# Altium footprint library 3D_MIG_Controller.PCBLIB: 560 footprints (part 20 of 35)
Each footprint in its own frame and in the unit in brackets; x right, y up, seen from the top. Pads: shape width x height; smd on the part's side, far side on the other; paste and mask are expansions set on the pad; w line width, h text height; cw(c..) or ccw(c..) is an arc to the next point about the centre after c.
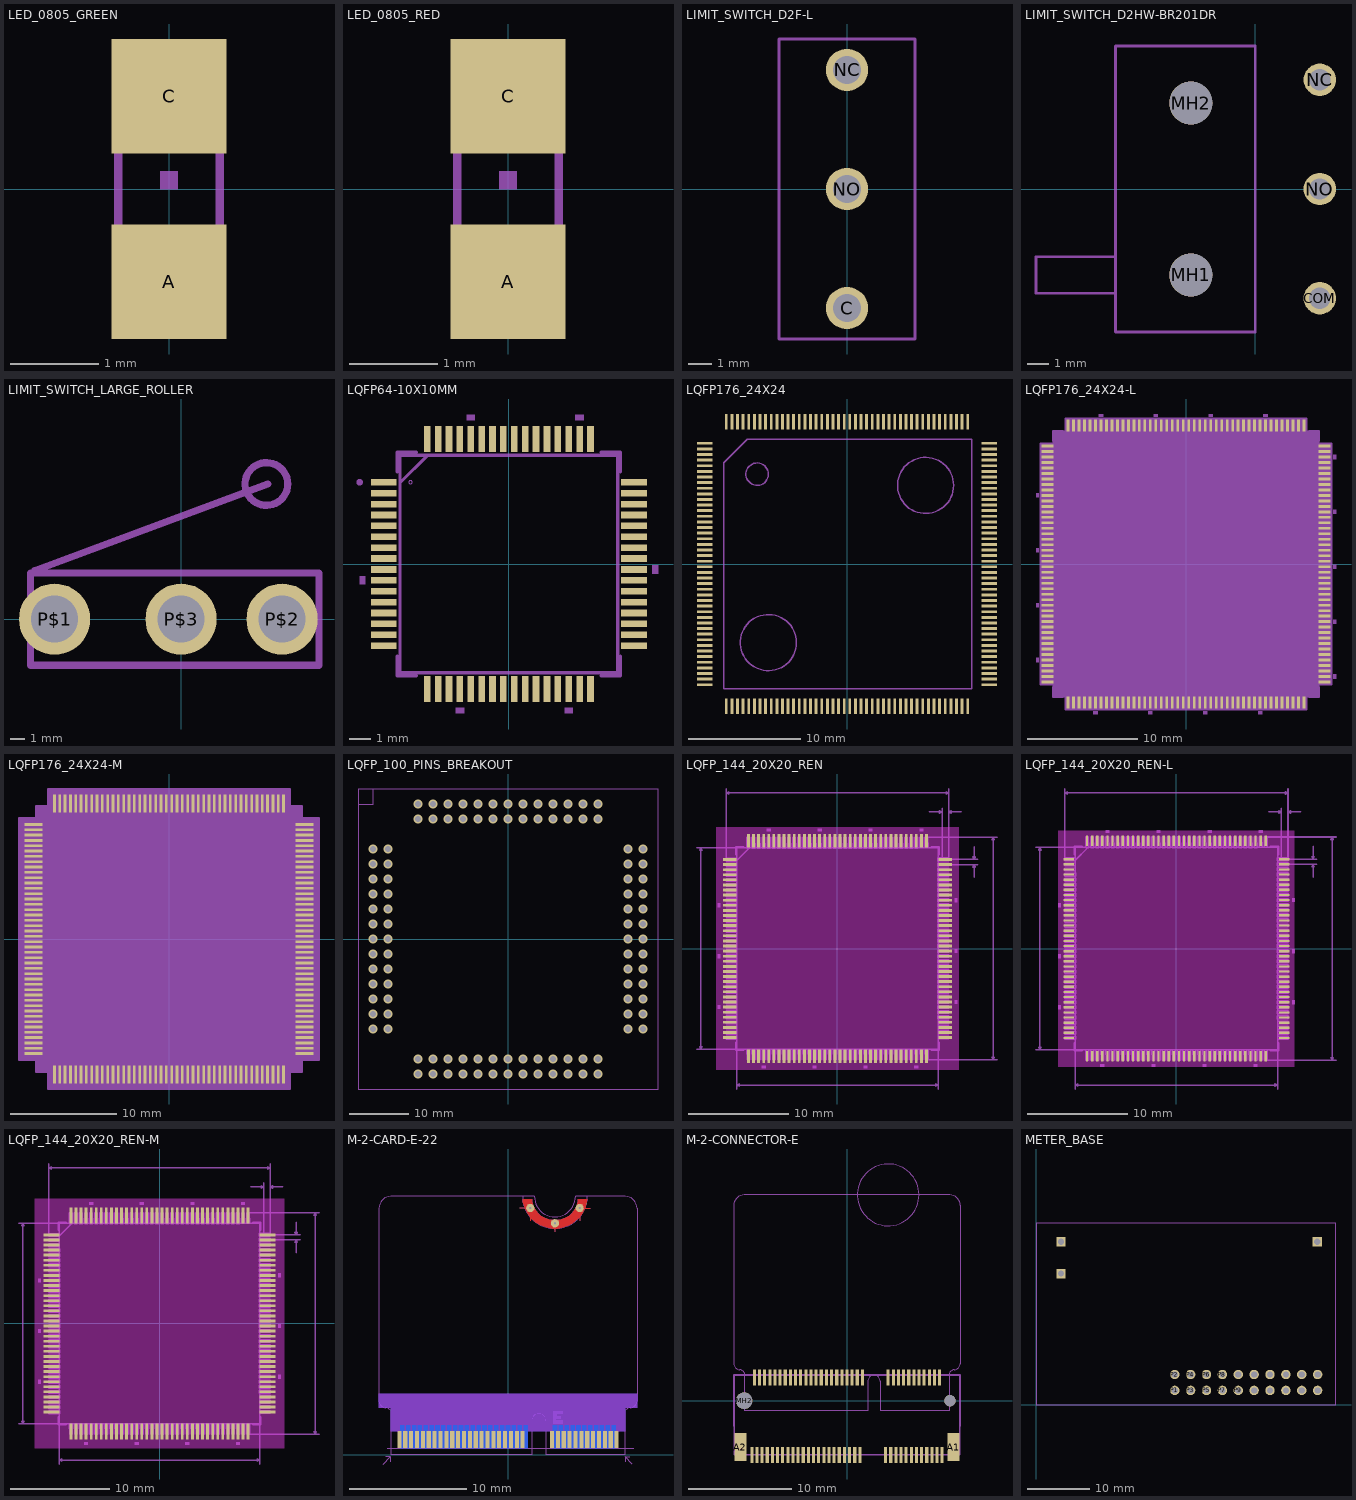
[diagram p19: the footprints below, top view; thin cyan lines are the x and y axes]

## LED_0805_GREEN [mil]
pads (2):
  rect 51.18x51.18 smd: A(0,-41.34) C(0,41.34)
tDocu:
  circle w4: c-17.72,33.46 r4.06
  region: 11.81,19.69 11.81,39.37 24.61,39.37 24.61,19.69
  region: -12.8,19.69 -12.8,29.53 -6.89,29.53 -6.89,19.69
  region: 6.89,19.69 6.89,29.53 12.8,29.53 12.8,19.69
  region: -7.87,19.69 -7.87,26.57 7.87,26.57 7.87,19.69
  region: 11.81,-39.37 11.81,-19.69 24.61,-19.69 24.61,-39.37
  region: -24.61,-39.37 -24.61,-19.69 -11.81,-19.69 -11.81,-39.37
  region: 6.89,-29.53 6.89,-19.69 12.8,-19.69 12.8,-29.53
  region: -12.8,-29.53 -12.8,-19.69 -6.89,-19.69 -6.89,-29.53
  region: -7.87,-26.57 -7.87,-19.69 7.87,-19.69 7.87,-26.57
  region: -23.62,19.69 -23.62,31.5 -11.81,31.5 -11.81,19.69
  region: -24.61,36.42 -24.61,39.37 -11.81,39.37 -11.81,36.42
  lines w4: -22.64,-19.69 -22.64,36.42 ; -13.78,-36.42 cw(c0,-38.55) 13.78,-36.42 ; -13.78,36.42 ccw(c0,38.55) 13.78,36.42 ; 22.64,-20.67 22.64,20.67
tPlace:
  region: -3.94,0 -3.94,7.87 3.94,7.87 3.94,0

## LED_0805_RED [mil]
pads (2):
  rect 51.18x51.18 smd: A(0,-41.34) C(0,41.34)
tDocu:
  circle w4: c-17.72,33.46 r4.06
  region: 11.81,19.69 11.81,39.37 24.61,39.37 24.61,19.69
  region: -12.8,19.69 -12.8,29.53 -6.89,29.53 -6.89,19.69
  region: 6.89,19.69 6.89,29.53 12.8,29.53 12.8,19.69
  region: -7.87,19.69 -7.87,26.57 7.87,26.57 7.87,19.69
  region: 11.81,-39.37 11.81,-19.69 24.61,-19.69 24.61,-39.37
  region: -24.61,-39.37 -24.61,-19.69 -11.81,-19.69 -11.81,-39.37
  region: 6.89,-29.53 6.89,-19.69 12.8,-19.69 12.8,-29.53
  region: -12.8,-29.53 -12.8,-19.69 -6.89,-19.69 -6.89,-29.53
  region: -7.87,-26.57 -7.87,-19.69 7.87,-19.69 7.87,-26.57
  region: -23.62,19.69 -23.62,31.5 -11.81,31.5 -11.81,19.69
  region: -24.61,36.42 -24.61,39.37 -11.81,39.37 -11.81,36.42
  lines w4: -22.64,-19.69 -22.64,36.42 ; -13.78,-36.42 cw(c0,-38.55) 13.78,-36.42 ; -13.78,36.42 ccw(c0,38.55) 13.78,36.42 ; 22.64,-20.67 22.64,20.67
tValues:
  text "RED" at 100,-50 h23.25
tPlace:
  region: -3.94,0 -3.94,7.87 3.94,7.87 3.94,0

## LIMIT_SWITCH_D2F-L [mil]
pads (3):
  round 70.86 hole 47.24: C(0,-200) NC(0,200) NO(0,0)
tPlace:
  lines w5: -114.17,-251.97 114.17,-251.97 114.17,251.97 -114.17,251.97 -114.17,-251.97

## LIMIT_SWITCH_D2HW-BR201DR [mm]
pads (5):
  round 1.508 hole 1: COM(3,-5.08) NC(3,5.08) NO(3,0)
  round 1.999 hole 1.999 unplated: MH1(-3,-4) MH2(-3,4)
tPlace:
  lines w0.127: -6.5,-4.85 -6.5,-3.15 ; -6.5,-4.85 -6.5,-6.65 0,-6.65 0,6.65 -6.5,6.65 -6.5,-3.15 ; -6.5,-4.85 -10.2,-4.85 -10.2,-3.15 -6.5,-3.15

## LIMIT_SWITCH_LARGE_ROLLER [mm]
pads (3):
  round 5 hole 3.3: P$1(-8.9,0) P$2(7.1,0) P$3(0,0)
tPlace:
  circle w0.508: c6,9.5 r1.5
  lines w0.508: -10.3,3.4 6.1,9.5 ; -10.6,-3.25 -10.6,3.25 9.7,3.25 9.7,-3.25 -10.6,-3.25
  text "C" at -9.7,-5.1 h1.57
  text "NC" at 6.4,-5.1 h1.57
  text "NO" at -1.2,-5.1 h1.57

## LQFP64-10X10MM [mil]
pads (64):
  rect 47x12 smd: 1(-226.38,147.64) 2(-226.38,127.95) 3(-226.38,108.27) 4(-226.38,88.58) 5(-226.38,68.9) 6(-226.38,49.21) 7(-226.38,29.53) 8(-226.38,9.84) 9(-226.38,-9.84) 10(-226.38,-29.53) 11(-226.38,-49.21) 12(-226.38,-68.9) 13(-226.38,-88.58) 14(-226.38,-108.27) 15(-226.38,-127.95) 16(-226.38,-147.64) 33(226.38,-147.64) 34(226.38,-127.95) 35(226.38,-108.27) 36(226.38,-88.58) 37(226.38,-68.9) 38(226.38,-49.21) 39(226.38,-29.53) 40(226.38,-9.84) 41(226.38,9.84) 42(226.38,29.53) 43(226.38,49.21) 44(226.38,68.9) 45(226.38,88.58) 46(226.38,108.27) 47(226.38,127.95) 48(226.38,147.64)
  rect 12x47 smd: 17(-147.64,-226.38) 18(-127.95,-226.38) 19(-108.27,-226.38) 20(-88.58,-226.38) 21(-68.9,-226.38) 22(-49.21,-226.38) 23(-29.53,-226.38) 24(-9.84,-226.38) 25(9.84,-226.38) 26(29.53,-226.38) 27(49.21,-226.38) 28(68.9,-226.38) 29(88.58,-226.38) 30(108.27,-226.38) 31(127.95,-226.38) 32(147.64,-226.38) 49(147.64,226.38) 50(127.95,226.38) 51(108.27,226.38) 52(88.58,226.38) 53(68.9,226.38) 54(49.21,226.38) 55(29.53,226.38) 56(9.84,226.38) 57(-9.84,226.38) 58(-29.53,226.38) 59(-49.21,226.38) 60(-68.9,226.38) 61(-88.58,226.38) 62(-108.27,226.38) 63(-127.95,226.38) 64(-147.64,226.38)
tDocu:
  lines w0: -181,148 ccw(c-178,148) -175,148 ccw(c-178,148) -181,148
  lines w6: -197,147 -147,197 ; -197,-197 197,-197 197,197 -197,197 -197,-197
tPlace:
  region: -269.88,-22.03 -269.88,-37.03 -259.88,-37.03 -259.88,-22.03
  region: -96.08,-259.88 -96.08,-269.88 -81.08,-269.88 -81.08,-259.88
  region: 100.77,-259.88 100.77,-269.88 115.77,-269.88 115.77,-259.88
  region: 269.88,-2.34 269.88,-17.34 259.88,-17.34 259.88,-2.34
  region: 120.45,259.88 120.45,269.88 135.45,269.88 135.45,259.88
  region: -76.4,259.88 -76.4,269.88 -61.4,269.88 -61.4,259.88
  lines w6: -202,-167 -202,-202 -167,-202 ; -202,167 -202,202 -167,202 ; 167,-202 202,-202 202,-167 ; 167,202 202,202 202,167 ; -273,148 ccw(c-270,148) -267,148 ccw(c-270,148) -273,148

## LQFP176_24X24 [mil]
pads (176):
  rect 54x10 smd: 1(-499,423.23) 2(-499,403.54) 3(-499,383.86) 4(-499,364.17) 5(-499,344.49) 6(-499,324.8) 7(-499,305.12) 8(-499,285.43) 9(-499,265.75) 10(-499,246.06) 11(-499,226.38) 12(-499,206.69) 13(-499,187.01) 14(-499,167.32) 15(-499,147.64) 16(-499,127.95) 17(-499,108.27) 18(-499,88.58) 19(-499,68.9) 20(-499,49.21) 21(-499,29.53) 22(-499,9.84) 23(-499,-9.84) 24(-499,-29.53) 25(-499,-49.21) 26(-499,-68.9) 27(-499,-88.58) 28(-499,-108.27) 29(-499,-127.95) 30(-499,-147.64) 31(-499,-167.32) 32(-499,-187.01) 33(-499,-206.69) 34(-499,-226.38) 35(-499,-246.06) 36(-499,-265.75) 37(-499,-285.43) 38(-499,-305.12) 39(-499,-324.8) 40(-499,-344.49) 41(-499,-364.17) 42(-499,-383.86) 43(-499,-403.54) 44(-499,-423.23) 89(499,-423.23) 90(499,-403.54) 91(499,-383.86) 92(499,-364.17) 93(499,-344.49) 94(499,-324.8) 95(499,-305.12) 96(499,-285.43) 97(499,-265.75) 98(499,-246.06) 99(499,-226.38) 100(499,-206.69) 101(499,-187.01) 102(499,-167.32) 103(499,-147.64) 104(499,-127.95) 105(499,-108.27) 106(499,-88.58) 107(499,-68.9) 108(499,-49.21) 109(499,-29.53) 110(499,-9.84) 111(499,9.84) 112(499,29.53) 113(499,49.21) 114(499,68.9) 115(499,88.58) 116(499,108.27) 117(499,127.95) 118(499,147.64) 119(499,167.32) 120(499,187.01) 121(499,206.69) 122(499,226.38) 123(499,246.06) 124(499,265.75) 125(499,285.43) 126(499,305.12) 127(499,324.8) 128(499,344.49) 129(499,364.17) 130(499,383.86) 131(499,403.54) 132(499,423.23)
  rect 10x54 smd: 45(-423.23,-499) 46(-403.54,-499) 47(-383.86,-499) 48(-364.17,-499) 49(-344.49,-499) 50(-324.8,-499) 51(-305.12,-499) 52(-285.43,-499) 53(-265.75,-499) 54(-246.06,-499) 55(-226.38,-499) 56(-206.69,-499) 57(-187.01,-499) 58(-167.32,-499) 59(-147.64,-499) 60(-127.95,-499) 61(-108.27,-499) 62(-88.58,-499) 63(-68.9,-499) 64(-49.21,-499) 65(-29.53,-499) 66(-9.84,-499) 67(9.84,-499) 68(29.53,-499) 69(49.21,-499) 70(68.9,-499) 71(88.58,-499) 72(108.27,-499) 73(127.95,-499) 74(147.64,-499) 75(167.32,-499) 76(187.01,-499) 77(206.69,-499) 78(226.38,-499) 79(246.06,-499) 80(265.75,-499) 81(285.43,-499) 82(305.12,-499) 83(324.8,-499) 84(344.49,-499) 85(364.17,-499) 86(383.86,-499) 87(403.54,-499) 88(423.23,-499) 133(423.23,499) 134(403.54,499) 135(383.86,499) 136(364.17,499) 137(344.49,499) 138(324.8,499) 139(305.12,499) 140(285.43,499) 141(265.75,499) 142(246.06,499) 143(226.38,499) 144(206.69,499) 145(187.01,499) 146(167.32,499) 147(147.64,499) 148(127.95,499) 149(108.27,499) 150(88.58,499) 151(68.9,499) 152(49.21,499) 153(29.53,499) 154(9.84,499) 155(-9.84,499) 156(-29.53,499) 157(-49.21,499) 158(-68.9,499) 159(-88.58,499) 160(-108.27,499) 161(-127.95,499) 162(-147.64,499) 163(-167.32,499) 164(-187.01,499) 165(-206.69,499) 166(-226.38,499) 167(-246.06,499) 168(-265.75,499) 169(-285.43,499) 170(-305.12,499) 171(-324.8,499) 172(-344.49,499) 173(-364.17,499) 174(-383.86,499) 175(-403.54,499) 176(-423.23,499)
tPlace:
  circle w5: c-314.96,314.96 r39.37
  circle w5: c-275.59,-275.59 r98.43
  circle w5: c275.59,275.59 r98.43
  lines w5: -433.07,-437.01 -433.07,354.33 -350.39,437.01 437.01,437.01 437.01,-437.01 -433.07,-437.01

## LQFP176_24X24-L [mil]
pads (176):
  rect 42x10 smd: 1(-497,423.23) 2(-497,403.54) 3(-497,383.86) 4(-497,364.17) 5(-497,344.49) 6(-497,324.8) 7(-497,305.12) 8(-497,285.43) 9(-497,265.75) 10(-497,246.06) 11(-497,226.38) 12(-497,206.69) 13(-497,187.01) 14(-497,167.32) 15(-497,147.64) 16(-497,127.95) 17(-497,108.27) 18(-497,88.58) 19(-497,68.9) 20(-497,49.21) 21(-497,29.53) 22(-497,9.84) 23(-497,-9.84) 24(-497,-29.53) 25(-497,-49.21) 26(-497,-68.9) 27(-497,-88.58) 28(-497,-108.27) 29(-497,-127.95) 30(-497,-147.64) 31(-497,-167.32) 32(-497,-187.01) 33(-497,-206.69) 34(-497,-226.38) 35(-497,-246.06) 36(-497,-265.75) 37(-497,-285.43) 38(-497,-305.12) 39(-497,-324.8) 40(-497,-344.49) 41(-497,-364.17) 42(-497,-383.86) 43(-497,-403.54) 44(-497,-423.23) 89(497,-423.23) 90(497,-403.54) 91(497,-383.86) 92(497,-364.17) 93(497,-344.49) 94(497,-324.8) 95(497,-305.12) 96(497,-285.43) 97(497,-265.75) 98(497,-246.06) 99(497,-226.38) 100(497,-206.69) 101(497,-187.01) 102(497,-167.32) 103(497,-147.64) 104(497,-127.95) 105(497,-108.27) 106(497,-88.58) 107(497,-68.9) 108(497,-49.21) 109(497,-29.53) 110(497,-9.84) 111(497,9.84) 112(497,29.53) 113(497,49.21) 114(497,68.9) 115(497,88.58) 116(497,108.27) 117(497,127.95) 118(497,147.64) 119(497,167.32) 120(497,187.01) 121(497,206.69) 122(497,226.38) 123(497,246.06) 124(497,265.75) 125(497,285.43) 126(497,305.12) 127(497,324.8) 128(497,344.49) 129(497,364.17) 130(497,383.86) 131(497,403.54) 132(497,423.23)
  rect 10x42 smd: 45(-423.23,-497) 46(-403.54,-497) 47(-383.86,-497) 48(-364.17,-497) 49(-344.49,-497) 50(-324.8,-497) 51(-305.12,-497) 52(-285.43,-497) 53(-265.75,-497) 54(-246.06,-497) 55(-226.38,-497) 56(-206.69,-497) 57(-187.01,-497) 58(-167.32,-497) 59(-147.64,-497) 60(-127.95,-497) 61(-108.27,-497) 62(-88.58,-497) 63(-68.9,-497) 64(-49.21,-497) 65(-29.53,-497) 66(-9.84,-497) 67(9.84,-497) 68(29.53,-497) 69(49.21,-497) 70(68.9,-497) 71(88.58,-497) 72(108.27,-497) 73(127.95,-497) 74(147.64,-497) 75(167.32,-497) 76(187.01,-497) 77(206.69,-497) 78(226.38,-497) 79(246.06,-497) 80(265.75,-497) 81(285.43,-497) 82(305.12,-497) 83(324.8,-497) 84(344.49,-497) 85(364.17,-497) 86(383.86,-497) 87(403.54,-497) 88(423.23,-497) 133(423.23,497) 134(403.54,497) 135(383.86,497) 136(364.17,497) 137(344.49,497) 138(324.8,497) 139(305.12,497) 140(285.43,497) 141(265.75,497) 142(246.06,497) 143(226.38,497) 144(206.69,497) 145(187.01,497) 146(167.32,497) 147(147.64,497) 148(127.95,497) 149(108.27,497) 150(88.58,497) 151(68.9,497) 152(49.21,497) 153(29.53,497) 154(9.84,497) 155(-9.84,497) 156(-29.53,497) 157(-49.21,497) 158(-68.9,497) 159(-88.58,497) 160(-108.27,497) 161(-127.95,497) 162(-147.64,497) 163(-167.32,497) 164(-187.01,497) 165(-206.69,497) 166(-226.38,497) 167(-246.06,497) 168(-265.75,497) 169(-285.43,497) 170(-305.12,497) 171(-324.8,497) 172(-344.49,497) 173(-364.17,497) 174(-383.86,497) 175(-403.54,497) 176(-423.23,497)
tDocu:
  drawing of 732 lines, arcs and shapes, not listed
  text "*" at -480,408 h62
tPlace:
  region: -538,253.56 -538,238.56 -528,238.56 -528,253.56
  region: -538,56.71 -538,41.71 -528,41.71 -528,56.71
  region: -538,-140.14 -538,-155.14 -528,-155.14 -528,-140.14
  region: -538,-336.99 -538,-351.99 -528,-351.99 -528,-336.99
  region: -332.3,-528 -332.3,-538 -317.3,-538 -317.3,-528
  region: -135.45,-528 -135.45,-538 -120.45,-538 -120.45,-528
  region: 61.4,-528 61.4,-538 76.4,-538 76.4,-528
  region: 258.25,-528 258.25,-538 273.25,-538 273.25,-528
  region: 538,-396.04 538,-411.04 528,-411.04 528,-396.04
  region: 538,-199.19 538,-214.19 528,-214.19 528,-199.19
  region: 538,-2.34 538,-17.34 528,-17.34 528,-2.34
  region: 538,194.51 538,179.51 528,179.51 528,194.51
  region: 538,391.36 538,376.36 528,376.36 528,391.36
  region: 277.93,528 277.93,538 292.93,538 292.93,528
  region: 81.08,528 81.08,538 96.08,538 96.08,528
  region: -115.77,528 -115.77,538 -100.77,538 -100.77,528
  region: -312.62,528 -312.62,538 -297.62,538 -297.62,528
  lines w6: -478,-441 -478,-478 -441,-478 ; -478,441 -478,478 -441,478 ; 441,-478 478,-478 478,-441 ; 441,478 478,478 478,441
tOrigins:
  lines w6: -10,0 10,0 ; 0,-10 0,10

## LQFP176_24X24-M [mil]
pads (176):
  rect 66x10 smd: 1(-501,423.23) 2(-501,403.54) 3(-501,383.86) 4(-501,364.17) 5(-501,344.49) 6(-501,324.8) 7(-501,305.12) 8(-501,285.43) 9(-501,265.75) 10(-501,246.06) 11(-501,226.38) 12(-501,206.69) 13(-501,187.01) 14(-501,167.32) 15(-501,147.64) 16(-501,127.95) 17(-501,108.27) 18(-501,88.58) 19(-501,68.9) 20(-501,49.21) 21(-501,29.53) 22(-501,9.84) 23(-501,-9.84) 24(-501,-29.53) 25(-501,-49.21) 26(-501,-68.9) 27(-501,-88.58) 28(-501,-108.27) 29(-501,-127.95) 30(-501,-147.64) 31(-501,-167.32) 32(-501,-187.01) 33(-501,-206.69) 34(-501,-226.38) 35(-501,-246.06) 36(-501,-265.75) 37(-501,-285.43) 38(-501,-305.12) 39(-501,-324.8) 40(-501,-344.49) 41(-501,-364.17) 42(-501,-383.86) 43(-501,-403.54) 44(-501,-423.23) 89(501,-423.23) 90(501,-403.54) 91(501,-383.86) 92(501,-364.17) 93(501,-344.49) 94(501,-324.8) 95(501,-305.12) 96(501,-285.43) 97(501,-265.75) 98(501,-246.06) 99(501,-226.38) 100(501,-206.69) 101(501,-187.01) 102(501,-167.32) 103(501,-147.64) 104(501,-127.95) 105(501,-108.27) 106(501,-88.58) 107(501,-68.9) 108(501,-49.21) 109(501,-29.53) 110(501,-9.84) 111(501,9.84) 112(501,29.53) 113(501,49.21) 114(501,68.9) 115(501,88.58) 116(501,108.27) 117(501,127.95) 118(501,147.64) 119(501,167.32) 120(501,187.01) 121(501,206.69) 122(501,226.38) 123(501,246.06) 124(501,265.75) 125(501,285.43) 126(501,305.12) 127(501,324.8) 128(501,344.49) 129(501,364.17) 130(501,383.86) 131(501,403.54) 132(501,423.23)
  rect 10x66 smd: 45(-423.23,-501) 46(-403.54,-501) 47(-383.86,-501) 48(-364.17,-501) 49(-344.49,-501) 50(-324.8,-501) 51(-305.12,-501) 52(-285.43,-501) 53(-265.75,-501) 54(-246.06,-501) 55(-226.38,-501) 56(-206.69,-501) 57(-187.01,-501) 58(-167.32,-501) 59(-147.64,-501) 60(-127.95,-501) 61(-108.27,-501) 62(-88.58,-501) 63(-68.9,-501) 64(-49.21,-501) 65(-29.53,-501) 66(-9.84,-501) 67(9.84,-501) 68(29.53,-501) 69(49.21,-501) 70(68.9,-501) 71(88.58,-501) 72(108.27,-501) 73(127.95,-501) 74(147.64,-501) 75(167.32,-501) 76(187.01,-501) 77(206.69,-501) 78(226.38,-501) 79(246.06,-501) 80(265.75,-501) 81(285.43,-501) 82(305.12,-501) 83(324.8,-501) 84(344.49,-501) 85(364.17,-501) 86(383.86,-501) 87(403.54,-501) 88(423.23,-501) 133(423.23,501) 134(403.54,501) 135(383.86,501) 136(364.17,501) 137(344.49,501) 138(324.8,501) 139(305.12,501) 140(285.43,501) 141(265.75,501) 142(246.06,501) 143(226.38,501) 144(206.69,501) 145(187.01,501) 146(167.32,501) 147(147.64,501) 148(127.95,501) 149(108.27,501) 150(88.58,501) 151(68.9,501) 152(49.21,501) 153(29.53,501) 154(9.84,501) 155(-9.84,501) 156(-29.53,501) 157(-49.21,501) 158(-68.9,501) 159(-88.58,501) 160(-108.27,501) 161(-127.95,501) 162(-147.64,501) 163(-167.32,501) 164(-187.01,501) 165(-206.69,501) 166(-226.38,501) 167(-246.06,501) 168(-265.75,501) 169(-285.43,501) 170(-305.12,501) 171(-324.8,501) 172(-344.49,501) 173(-364.17,501) 174(-383.86,501) 175(-403.54,501) 176(-423.23,501)
tDocu:
  drawing of 732 lines, arcs and shapes, not listed
  text "*" at -480,408 h62
tPlace:
  region: -554,253.56 -554,238.56 -544,238.56 -544,253.56
  region: -554,56.71 -554,41.71 -544,41.71 -544,56.71
  region: -554,-140.14 -554,-155.14 -544,-155.14 -544,-140.14
  region: -554,-336.99 -554,-351.99 -544,-351.99 -544,-336.99
  region: -332.3,-544 -332.3,-554 -317.3,-554 -317.3,-544
  region: -135.45,-544 -135.45,-554 -120.45,-554 -120.45,-544
  region: 61.4,-544 61.4,-554 76.4,-554 76.4,-544
  region: 258.25,-544 258.25,-554 273.25,-554 273.25,-544
  region: 554,-396.04 554,-411.04 544,-411.04 544,-396.04
  region: 554,-199.19 554,-214.19 544,-214.19 544,-199.19
  region: 554,-2.34 554,-17.34 544,-17.34 544,-2.34
  region: 554,194.51 554,179.51 544,179.51 544,194.51
  region: 554,391.36 554,376.36 544,376.36 544,391.36
  region: 277.93,544 277.93,554 292.93,554 292.93,544
  region: 81.08,544 81.08,554 96.08,554 96.08,544
  region: -115.77,544 -115.77,554 -100.77,554 -100.77,544
  region: -312.62,544 -312.62,554 -297.62,554 -297.62,544
  lines w6: -478,-441 -478,-478 -441,-478 ; -478,441 -478,478 -441,478 ; 441,-478 478,-478 478,-441 ; 441,478 478,478 478,441
tOrigins:
  lines w6: -10,0 10,0 ; 0,-10 0,10

## LQFP_100_PINS_BREAKOUT [mm]
pads (104):
  round 1.508 hole 1: P$000(-20.32,15.24) P$1(-22.86,15.24) P$2(-22.86,12.7) P$3(-20.32,12.7) P$4(-22.86,10.16) P$5(-20.32,10.16) P$6(-22.86,7.62) P$7(-20.32,7.62) P$8(-22.86,5.08) P$9(-20.32,5.08) P$10(-22.86,2.54) P$11(-20.32,2.54) P$12(-22.86,0) P$13(-20.32,0) P$14(-22.86,-2.54) P$15(-20.32,-2.54) P$16(-22.86,-5.08) P$17(-20.32,-5.08) P$18(-22.86,-7.62) P$19(-20.32,-7.62) P$20(-22.86,-10.16) P$21(-20.32,-10.16) P$22(-22.86,-12.7) P$23(-20.32,-12.7) P$24(-22.86,-15.24) P$25(-20.32,-15.24) P$26(-15.24,-22.86) P$27(-12.7,-22.86) P$28(-12.7,-20.32) P$29(-10.16,-22.86) P$30(-10.16,-20.32) P$31(-7.62,-22.86) P$32(-7.62,-20.32) P$33(-5.08,-22.86) P$34(-5.08,-20.32) P$35(-2.54,-22.86) P$36(-2.54,-20.32) P$37(0,-22.86) P$38(0,-20.32) P$39(2.54,-22.86) P$40(2.54,-20.32) P$41(5.08,-22.86) P$42(5.08,-20.32) P$43(7.62,-22.86) P$44(7.62,-20.32) P$45(10.16,-22.86) P$46(10.16,-20.32) P$47(12.7,-22.86) P$48(12.7,-20.32) P$49(15.24,-22.86) P$50(15.24,-20.32) P$51(22.86,-15.24) P$52(22.86,-12.7) P$53(20.32,-12.7) P$54(22.86,-10.16) P$55(20.32,-10.16) P$56(22.86,-7.62) P$57(20.32,-7.62) P$58(22.86,-5.08) P$59(20.32,-5.08) P$60(22.86,-2.54) P$61(20.32,-2.54) P$62(22.86,0) P$63(20.32,0) P$64(22.86,2.54) P$65(20.32,2.54) P$66(22.86,5.08) P$67(20.32,5.08) P$68(22.86,7.62) P$69(20.32,7.62) P$70(22.86,10.16) P$71(20.32,10.16) P$72(22.86,12.7) P$73(20.32,12.7) P$74(22.86,15.24) P$75(20.32,15.24) P$76(15.24,22.86) P$77(12.7,22.86) P$78(12.7,20.32) P$79(10.16,22.86) P$80(10.16,20.32) P$81(7.62,22.86) P$82(7.62,20.32) P$83(5.08,22.86) P$84(5.08,20.32) P$85(2.54,22.86) P$86(2.54,20.32) P$87(0,22.86) P$88(0,20.32) P$89(-2.54,22.86) P$90(-2.54,20.32) P$91(-5.08,22.86) P$92(-5.08,20.32) P$93(-7.62,22.86) P$94(-7.62,20.32) P$95(-10.16,22.86) P$96(-10.16,20.32) P$97(-12.7,22.86) P$98(-12.7,20.32) P$99(-15.24,22.86) P$100(-15.24,20.32) P$261(-15.24,-20.32) P$510(20.32,-15.24) P$760(15.24,20.32)
tPlace:
  lines w0.127: -25.4,22.86 -25.4,25.4 -22.86,25.4 ; -25.4,22.86 -25.4,-25.4 25.4,-25.4 25.4,25.4 -22.86,25.4 ; -25.4,22.86 -22.86,22.86 -22.86,25.4

## LQFP_144_20X20_REN [mil]
pads (144):
  rect 53.56x11 smd: 1(-424,350) 2(-424,330) 3(-424,310) 4(-424,290) 5(-424,270) 6(-424,250) 7(-424,230) 8(-424,210) 9(-424,190) 10(-424,170) 11(-424,150) 12(-424,130) 13(-424,110) 14(-424,90) 15(-424,70) 16(-424,50) 17(-424,30) 18(-424,10) 19(-424,-10) 20(-424,-30) 21(-424,-50) 22(-424,-70) 23(-424,-90) 24(-424,-110) 25(-424,-130) 26(-424,-150) 27(-424,-170) 28(-424,-190) 29(-424,-210) 30(-424,-230) 31(-424,-250) 32(-424,-270) 33(-424,-290) 34(-424,-310) 35(-424,-330) 36(-424,-350) 73(424,-350) 74(424,-330) 75(424,-310) 76(424,-290) 77(424,-270) 78(424,-250) 79(424,-230) 80(424,-210) 81(424,-190) 82(424,-170) 83(424,-150) 84(424,-130) 85(424,-110) 86(424,-90) 87(424,-70) 88(424,-50) 89(424,-30) 90(424,-10) 91(424,10) 92(424,30) 93(424,50) 94(424,70) 95(424,90) 96(424,110) 97(424,130) 98(424,150) 99(424,170) 100(424,190) 101(424,210) 102(424,230) 103(424,250) 104(424,270) 105(424,290) 106(424,310) 107(424,330) 108(424,350)
  rect 11x53.56 smd: 37(-350,-424) 38(-330,-424) 39(-310,-424) 40(-290,-424) 41(-270,-424) 42(-250,-424) 43(-230,-424) 44(-210,-424) 45(-190,-424) 46(-170,-424) 47(-150,-424) 48(-130,-424) 49(-110,-424) 50(-90,-424) 51(-70,-424) 52(-50,-424) 53(-30,-424) 54(-10,-424) 55(10,-424) 56(30,-424) 57(50,-424) 58(70,-424) 59(90,-424) 60(110,-424) 61(130,-424) 62(150,-424) 63(170,-424) 64(190,-424) 65(210,-424) 66(230,-424) 67(250,-424) 68(270,-424) 69(290,-424) 70(310,-424) 71(330,-424) 72(350,-424) 109(350,424) 110(330,424) 111(310,424) 112(290,424) 113(270,424) 114(250,424) 115(230,424) 116(210,424) 117(190,424) 118(170,424) 119(150,424) 120(130,424) 121(110,424) 122(90,424) 123(70,424) 124(50,424) 125(30,424) 126(10,424) 127(-10,424) 128(-30,424) 129(-50,424) 130(-70,424) 131(-90,424) 132(-110,424) 133(-130,424) 134(-150,424) 135(-170,424) 136(-190,424) 137(-210,424) 138(-230,424) 139(-250,424) 140(-270,424) 141(-290,424) 142(-310,424) 143(-330,424) 144(-350,424)
Top keep-out:
  region: -475.78,-475.78 -475.78,475.78 475.78,475.78 475.78,-475.78
tDocu:
  drawing of 582 lines, arcs and shapes, not listed
  text "*" at -403,335 h77.5
tPlace:
  region: -470.78,177.5 -470.78,162.5 -460.78,162.5 -460.78,177.5
  region: -470.78,-22.5 -470.78,-37.5 -460.78,-37.5 -460.78,-22.5
  region: -470.78,-222.5 -470.78,-237.5 -460.78,-237.5 -460.78,-222.5
  region: -297.5,-460.78 -297.5,-470.78 -282.5,-470.78 -282.5,-460.78
  region: -97.5,-460.78 -97.5,-470.78 -82.5,-470.78 -82.5,-460.78
  region: 102.5,-460.78 102.5,-470.78 117.5,-470.78 117.5,-460.78
  region: 302.5,-460.78 302.5,-470.78 317.5,-470.78 317.5,-460.78
  region: 470.78,-202.5 470.78,-217.5 460.78,-217.5 460.78,-202.5
  region: 470.78,-2.5 470.78,-17.5 460.78,-17.5 460.78,-2.5
  region: 470.78,197.5 470.78,182.5 460.78,182.5 460.78,197.5
  region: 322.5,460.78 322.5,470.78 337.5,470.78 337.5,460.78
  region: 122.5,460.78 122.5,470.78 137.5,470.78 137.5,460.78
  region: -77.5,460.78 -77.5,470.78 -62.5,470.78 -62.5,460.78
  region: -277.5,460.78 -277.5,470.78 -262.5,470.78 -262.5,460.78
  lines w6: -400,-369 -400,-400 -369,-400 ; -400,369 -400,400 -369,400 ; 369,-400 400,-400 400,-369 ; 369,400 400,400 400,369
  text "*" at -498,350 h77.5
Measures:
  lines w6: -552,-396 -537,-396 ; -552,396 -537,396 ; -437,350 -437,612 ; -437,627 -437,612 ; -396,-552 -396,-537 ; -396,-350 -396,-537 ; -350,-396 -537,-396 ; -350,396 -537,396 ; 350,-437 612,-437 ; 350,437 612,437 ; 361,537 411,537 ; 396,-552 396,-537 ; 396,-350 396,-537 ; 411,350 411,537 ; 411,552 411,537 ; 424,330 537,330 ; 424,350 437,350 ; 437,627 437,612 ; 487,537 437,537 ; 537,280 537,330 ; 537,400 537,350 ; 552,330 537,330 ; 552,350 537,350 ; 627,-437 612,-437 ; 627,437 612,437 ; -537,-396 -537,396 ; -537,-396 -542,-386 -532,-386 -537,-396 ; -537,396 -542,386 -532,386 -537,396 ; -437,612 437,612 ; -437,612 -427,617 -427,607 -437,612 ; -396,-537 396,-537 ; -396,-537 -386,-532 -386,-542 -396,-537 ; 396,-537 386,-532 386,-542 396,-537 ; 411,537 401,542 401,532 411,537 ; 437,350 537,350 ; 437,350 437,537 ; 437,537 447,542 447,532 437,537 ; 437,537 437,612 ; 437,612 427,617 427,607 437,612 ; 537,330 532,320 542,320 537,330 ; 537,350 532,360 542,360 537,350 ; 612,-437 612,437 ; 612,-437 607,-427 617,-427 612,-437 ; 612,437 607,427 617,427 612,437
  text "Default Horiz Padstyle: r28_136" at -659,-687 h77.5
  text "Default Vert Padstyle: r28_136" at -637,-747 h77.5
  text "Alt 1 Padstyle: b152_229h76" at -583,-927 h77.5
  text "Alt 2 Padstyle: b229_152h76" at -583,-987 h77.5
  text "0.02in/0.508mm" at 557,328 h38.75
  text "0.026in/0.66mm" at 276,557 h38.75
  text "0.874in/22.2mm" at -148,632 h38.75
  text "0.791in/20.091mm" at -170,-582 h38.75
  text "0.791in/20.091mm" at -898,-12 h38.75
  text "0.874in/22.2mm" at 632,-12 h38.75

## LQFP_144_20X20_REN-L [mil]
pads (144):
  rect 41.75x9.03 smd: 1(-422.03,350) 2(-422.03,330) 3(-422.03,310) 4(-422.03,290) 5(-422.03,270) 6(-422.03,250) 7(-422.03,230) 8(-422.03,210) 9(-422.03,190) 10(-422.03,170) 11(-422.03,150) 12(-422.03,130) 13(-422.03,110) 14(-422.03,90) 15(-422.03,70) 16(-422.03,50) 17(-422.03,30) 18(-422.03,10) 19(-422.03,-10) 20(-422.03,-30) 21(-422.03,-50) 22(-422.03,-70) 23(-422.03,-90) 24(-422.03,-110) 25(-422.03,-130) 26(-422.03,-150) 27(-422.03,-170) 28(-422.03,-190) 29(-422.03,-210) 30(-422.03,-230) 31(-422.03,-250) 32(-422.03,-270) 33(-422.03,-290) 34(-422.03,-310) 35(-422.03,-330) 36(-422.03,-350) 73(422.03,-350) 74(422.03,-330) 75(422.03,-310) 76(422.03,-290) 77(422.03,-270) 78(422.03,-250) 79(422.03,-230) 80(422.03,-210) 81(422.03,-190) 82(422.03,-170) 83(422.03,-150) 84(422.03,-130) 85(422.03,-110) 86(422.03,-90) 87(422.03,-70) 88(422.03,-50) 89(422.03,-30) 90(422.03,-10) 91(422.03,10) 92(422.03,30) 93(422.03,50) 94(422.03,70) 95(422.03,90) 96(422.03,110) 97(422.03,130) 98(422.03,150) 99(422.03,170) 100(422.03,190) 101(422.03,210) 102(422.03,230) 103(422.03,250) 104(422.03,270) 105(422.03,290) 106(422.03,310) 107(422.03,330) 108(422.03,350)
  rect 9.03x41.75 smd: 37(-350,-422.03) 38(-330,-422.03) 39(-310,-422.03) 40(-290,-422.03) 41(-270,-422.03) 42(-250,-422.03) 43(-230,-422.03) 44(-210,-422.03) 45(-190,-422.03) 46(-170,-422.03) 47(-150,-422.03) 48(-130,-422.03) 49(-110,-422.03) 50(-90,-422.03) 51(-70,-422.03) 52(-50,-422.03) 53(-30,-422.03) 54(-10,-422.03) 55(10,-422.03) 56(30,-422.03) 57(50,-422.03) 58(70,-422.03) 59(90,-422.03) 60(110,-422.03) 61(130,-422.03) 62(150,-422.03) 63(170,-422.03) 64(190,-422.03) 65(210,-422.03) 66(230,-422.03) 67(250,-422.03) 68(270,-422.03) 69(290,-422.03) 70(310,-422.03) 71(330,-422.03) 72(350,-422.03) 109(350,422.03) 110(330,422.03) 111(310,422.03) 112(290,422.03) 113(270,422.03) 114(250,422.03) 115(230,422.03) 116(210,422.03) 117(190,422.03) 118(170,422.03) 119(150,422.03) 120(130,422.03) 121(110,422.03) 122(90,422.03) 123(70,422.03) 124(50,422.03) 125(30,422.03) 126(10,422.03) 127(-10,422.03) 128(-30,422.03) 129(-50,422.03) 130(-70,422.03) 131(-90,422.03) 132(-110,422.03) 133(-130,422.03) 134(-150,422.03) 135(-170,422.03) 136(-190,422.03) 137(-210,422.03) 138(-230,422.03) 139(-250,422.03) 140(-270,422.03) 141(-290,422.03) 142(-310,422.03) 143(-330,422.03) 144(-350,422.03)
Top keep-out:
  region: -461.91,-461.91 -461.91,461.91 461.91,461.91 461.91,-461.91
tDocu:
  drawing of 582 lines, arcs and shapes, not listed
  text "*" at -403,335 h77.5
tPlace:
  region: -462.91,177.5 -462.91,162.5 -452.91,162.5 -452.91,177.5
  region: -462.91,-22.5 -462.91,-37.5 -452.91,-37.5 -452.91,-22.5
  region: -462.91,-222.5 -462.91,-237.5 -452.91,-237.5 -452.91,-222.5
  region: -297.5,-452.91 -297.5,-462.91 -282.5,-462.91 -282.5,-452.91
  region: -97.5,-452.91 -97.5,-462.91 -82.5,-462.91 -82.5,-452.91
  region: 102.5,-452.91 102.5,-462.91 117.5,-462.91 117.5,-452.91
  region: 302.5,-452.91 302.5,-462.91 317.5,-462.91 317.5,-452.91
  region: 462.91,-202.5 462.91,-217.5 452.91,-217.5 452.91,-202.5
  region: 462.91,-2.5 462.91,-17.5 452.91,-17.5 452.91,-2.5
  region: 462.91,197.5 462.91,182.5 452.91,182.5 452.91,197.5
  region: 322.5,452.91 322.5,462.91 337.5,462.91 337.5,452.91
  region: 122.5,452.91 122.5,462.91 137.5,462.91 137.5,452.91
  region: -77.5,452.91 -77.5,462.91 -62.5,462.91 -62.5,452.91
  region: -277.5,452.91 -277.5,462.91 -262.5,462.91 -262.5,452.91
  lines w6: -400,-368 -400,-400 -368,-400 ; -400,368 -400,400 -368,400 ; 368,-400 400,-400 400,-368 ; 368,400 400,400 400,368
  text "*" at -491,350 h77.5
Measures:
  lines w6: -550,-396 -535,-396 ; -550,396 -535,396 ; -437,350 -437,610 ; -437,625 -437,610 ; -396,-550 -396,-535 ; -396,-350 -396,-535 ; -350,-396 -535,-396 ; -350,396 -535,396 ; 350,-437 610,-437 ; 350,437 610,437 ; 361,535 411,535 ; 396,-550 396,-535 ; 396,-350 396,-535 ; 411,350 411,535 ; 411,550 411,535 ; 422,330 535,330 ; 422,350 437,350 ; 437,625 437,610 ; 487,535 437,535 ; 535,280 535,330 ; 535,400 535,350 ; 550,330 535,330 ; 550,350 535,350 ; 625,-437 610,-437 ; 625,437 610,437 ; -535,-396 -535,396 ; -535,-396 -540,-386 -530,-386 -535,-396 ; -535,396 -540,386 -530,386 -535,396 ; -437,610 437,610 ; -437,610 -427,615 -427,605 -437,610 ; -396,-535 396,-535 ; -396,-535 -386,-530 -386,-540 -396,-535 ; 396,-535 386,-530 386,-540 396,-535 ; 411,535 401,540 401,530 411,535 ; 437,350 535,350 ; 437,350 437,535 ; 437,535 447,540 447,530 437,535 ; 437,535 437,610 ; 437,610 427,615 427,605 437,610 ; 535,330 530,320 540,320 535,330 ; 535,350 530,360 540,360 535,350 ; 610,-437 610,437 ; 610,-437 605,-427 615,-427 610,-437 ; 610,437 605,427 615,427 610,437
  text "Default Horiz Padstyle: r23_106" at -659,-685 h77.5
  text "Default Vert Padstyle: r23_106" at -637,-745 h77.5
  text "Alt 1 Padstyle: b152_229h76" at -583,-925 h77.5
  text "Alt 2 Padstyle: b229_152h76" at -583,-985 h77.5
  text "0.02in/0.508mm" at 555,328 h38.75
  text "0.026in/0.66mm" at 276,555 h38.75
  text "0.874in/22.2mm" at -148,630 h38.75
  text "0.791in/20.091mm" at -170,-580 h38.75
  text "0.791in/20.091mm" at -896,-12 h38.75
  text "0.874in/22.2mm" at 630,-12 h38.75

## LQFP_144_20X20_REN-M [mil]
pads (144):
  rect 63.15x11 smd: 1(-427.08,350) 2(-427.08,330) 3(-427.08,310) 4(-427.08,290) 5(-427.08,270) 6(-427.08,250) 7(-427.08,230) 8(-427.08,210) 9(-427.08,190) 10(-427.08,170) 11(-427.08,150) 12(-427.08,130) 13(-427.08,110) 14(-427.08,90) 15(-427.08,70) 16(-427.08,50) 17(-427.08,30) 18(-427.08,10) 19(-427.08,-10) 20(-427.08,-30) 21(-427.08,-50) 22(-427.08,-70) 23(-427.08,-90) 24(-427.08,-110) 25(-427.08,-130) 26(-427.08,-150) 27(-427.08,-170) 28(-427.08,-190) 29(-427.08,-210) 30(-427.08,-230) 31(-427.08,-250) 32(-427.08,-270) 33(-427.08,-290) 34(-427.08,-310) 35(-427.08,-330) 36(-427.08,-350) 73(427.08,-350) 74(427.08,-330) 75(427.08,-310) 76(427.08,-290) 77(427.08,-270) 78(427.08,-250) 79(427.08,-230) 80(427.08,-210) 81(427.08,-190) 82(427.08,-170) 83(427.08,-150) 84(427.08,-130) 85(427.08,-110) 86(427.08,-90) 87(427.08,-70) 88(427.08,-50) 89(427.08,-30) 90(427.08,-10) 91(427.08,10) 92(427.08,30) 93(427.08,50) 94(427.08,70) 95(427.08,90) 96(427.08,110) 97(427.08,130) 98(427.08,150) 99(427.08,170) 100(427.08,190) 101(427.08,210) 102(427.08,230) 103(427.08,250) 104(427.08,270) 105(427.08,290) 106(427.08,310) 107(427.08,330) 108(427.08,350)
  rect 11x63.15 smd: 37(-350,-427.08) 38(-330,-427.08) 39(-310,-427.08) 40(-290,-427.08) 41(-270,-427.08) 42(-250,-427.08) 43(-230,-427.08) 44(-210,-427.08) 45(-190,-427.08) 46(-170,-427.08) 47(-150,-427.08) 48(-130,-427.08) 49(-110,-427.08) 50(-90,-427.08) 51(-70,-427.08) 52(-50,-427.08) 53(-30,-427.08) 54(-10,-427.08) 55(10,-427.08) 56(30,-427.08) 57(50,-427.08) 58(70,-427.08) 59(90,-427.08) 60(110,-427.08) 61(130,-427.08) 62(150,-427.08) 63(170,-427.08) 64(190,-427.08) 65(210,-427.08) 66(230,-427.08) 67(250,-427.08) 68(270,-427.08) 69(290,-427.08) 70(310,-427.08) 71(330,-427.08) 72(350,-427.08) 109(350,427.08) 110(330,427.08) 111(310,427.08) 112(290,427.08) 113(270,427.08) 114(250,427.08) 115(230,427.08) 116(210,427.08) 117(190,427.08) 118(170,427.08) 119(150,427.08) 120(130,427.08) 121(110,427.08) 122(90,427.08) 123(70,427.08) 124(50,427.08) 125(30,427.08) 126(10,427.08) 127(-10,427.08) 128(-30,427.08) 129(-50,427.08) 130(-70,427.08) 131(-90,427.08) 132(-110,427.08) 133(-130,427.08) 134(-150,427.08) 135(-170,427.08) 136(-190,427.08) 137(-210,427.08) 138(-230,427.08) 139(-250,427.08) 140(-270,427.08) 141(-290,427.08) 142(-310,427.08) 143(-330,427.08) 144(-350,427.08)
Top keep-out:
  region: -493.65,-493.65 -493.65,493.65 493.65,493.65 493.65,-493.65
tDocu:
  drawing of 582 lines, arcs and shapes, not listed
  text "*" at -403,335 h77.5
tPlace:
  region: -478.65,177.5 -478.65,162.5 -468.65,162.5 -468.65,177.5
  region: -478.65,-22.5 -478.65,-37.5 -468.65,-37.5 -468.65,-22.5
  region: -478.65,-222.5 -478.65,-237.5 -468.65,-237.5 -468.65,-222.5
  region: -297.5,-468.65 -297.5,-478.65 -282.5,-478.65 -282.5,-468.65
  region: -97.5,-468.65 -97.5,-478.65 -82.5,-478.65 -82.5,-468.65
  region: 102.5,-468.65 102.5,-478.65 117.5,-478.65 117.5,-468.65
  region: 302.5,-468.65 302.5,-478.65 317.5,-478.65 317.5,-468.65
  region: 478.65,-202.5 478.65,-217.5 468.65,-217.5 468.65,-202.5
  region: 478.65,-2.5 478.65,-17.5 468.65,-17.5 468.65,-2.5
  region: 478.65,197.5 478.65,182.5 468.65,182.5 468.65,197.5
  region: 322.5,468.65 322.5,478.65 337.5,478.65 337.5,468.65
  region: 122.5,468.65 122.5,478.65 137.5,478.65 137.5,468.65
  region: -77.5,468.65 -77.5,478.65 -62.5,478.65 -62.5,468.65
  region: -277.5,468.65 -277.5,478.65 -262.5,478.65 -262.5,468.65
  lines w6: -400,-369 -400,-400 -369,-400 ; -400,369 -400,400 -369,400 ; 369,-400 400,-400 400,-369 ; 369,400 400,400 400,369
  text "*" at -506,350 h77.5
Measures:
  lines w6: -555,-396 -540,-396 ; -555,396 -540,396 ; -437,350 -437,615 ; -437,630 -437,615 ; -396,-555 -396,-540 ; -396,-350 -396,-540 ; -350,-396 -540,-396 ; -350,396 -540,396 ; 350,-437 615,-437 ; 350,437 615,437 ; 361,540 411,540 ; 396,-555 396,-540 ; 396,-350 396,-540 ; 411,350 411,540 ; 411,555 411,540 ; 427,330 540,330 ; 427,350 437,350 ; 437,630 437,615 ; 487,540 437,540 ; 540,280 540,330 ; 540,400 540,350 ; 555,330 540,330 ; 555,350 540,350 ; 630,-437 615,-437 ; 630,437 615,437 ; -540,-396 -540,396 ; -540,-396 -545,-386 -535,-386 -540,-396 ; -540,396 -545,386 -535,386 -540,396 ; -437,615 437,615 ; -437,615 -427,620 -427,610 -437,615 ; -396,-540 396,-540 ; -396,-540 -386,-535 -386,-545 -396,-540 ; 396,-540 386,-535 386,-545 396,-540 ; 411,540 401,545 401,535 411,540 ; 437,350 540,350 ; 437,350 437,540 ; 437,540 447,545 447,535 437,540 ; 437,540 437,615 ; 437,615 427,620 427,610 437,615 ; 540,330 535,320 545,320 540,330 ; 540,350 535,360 545,360 540,350 ; 615,-437 615,437 ; 615,-437 610,-427 620,-427 615,-437 ; 615,437 610,427 620,427 615,437
  text "Default Horiz Padstyle: r28_160" at -659,-690 h77.5
  text "Default Vert Padstyle: r28_160" at -637,-750 h77.5
  text "Alt 1 Padstyle: b152_229h76" at -583,-930 h77.5
  text "Alt 2 Padstyle: b229_152h76" at -583,-990 h77.5
  text "0.02in/0.508mm" at 560,328 h38.75
  text "0.026in/0.66mm" at 276,560 h38.75
  text "0.874in/22.2mm" at -148,635 h38.75
  text "0.791in/20.091mm" at -170,-585 h38.75
  text "0.791in/20.091mm" at -901,-12 h38.75
  text "0.874in/22.2mm" at 635,-12 h38.75

## M-2-CARD-E-22 [mm]
pads (70):
  rect 0.35x1.45 smd paste+0: 1(9.25,1.275) 3(8.75,1.275) 5(8.25,1.275) 7(7.75,1.275) 9(7.25,1.275) 11(6.75,1.275) 13(6.25,1.275) 15(5.75,1.275) 17(5.25,1.275) 19(4.75,1.275) 21(4.25,1.275) 23(3.75,1.275) 33(1.25,1.275) 35(0.75,1.275) 37(0.25,1.275) 39(-0.25,1.275) 41(-0.75,1.275) 43(-1.25,1.275) 45(-1.75,1.275) 47(-2.25,1.275) 49(-2.75,1.275) 51(-3.25,1.275) 53(-3.75,1.275) 55(-4.25,1.275) 57(-4.75,1.275) 59(-5.25,1.275) 61(-5.75,1.275) 63(-6.25,1.275) 65(-6.75,1.275) 67(-7.25,1.275) 69(-7.75,1.275) 71(-8.25,1.275) 73(-8.75,1.275) 75(-9.25,1.275)
  rect 0.35x1.95 smd far side paste+0: 2(9,1.525) 4(8.5,1.525) 6(8,1.525) 8(7.5,1.525) 10(7,1.525) 12(6.5,1.525) 14(6,1.525) 16(5.5,1.525) 18(5,1.525) 20(4.5,1.525) 22(4,1.525) 32(1.5,1.525) 34(1,1.525) 36(0.5,1.525) 38(0,1.525) 40(-0.5,1.525) 42(-1,1.525) 44(-1.5,1.525) 46(-2,1.525) 48(-2.5,1.525) 50(-3,1.525) 52(-3.5,1.525) 54(-4,1.525) 56(-4.5,1.525) 58(-5,1.525) 60(-5.5,1.525) 62(-6,1.525) 64(-6.5,1.525) 66(-7,1.525) 68(-7.5,1.525) 70(-8,1.525) 72(-8.5,1.525) 74(-9,1.525)
  round 0.708 hole 0.2: GND1(1.9,21) GND2(4,19.7) GND3(6.1,21)
Top:
  region: 1.25,21.75 2.05,21.75 2.069,21.569 2.159,21.217 2.316,20.89 2.533,20.599 2.804,20.356 3.116,20.171 3.459,20.051 3.818,19.999 4,20 4.182,19.999 4.541,20.051 4.884,20.171 5.196,20.356 5.467,20.599 5.684,20.89 5.841,21.217 5.931,21.569 5.95,21.75 6.75,21.75 6.723,21.497 6.579,21.008 6.348,20.553 6.04,20.148 5.662,19.805 5.23,19.536 4.755,19.35 4.255,19.253 4,19.25 3.745,19.251 3.243,19.345 2.767,19.53 2.332,19.799 1.955,20.142 1.646,20.549 1.417,21.005 1.275,21.496 1.25,21.75
  lines w0.102: 1,21 1.9,21 1.9,19.9 ; 4,19 4,19.7 ; 6.1,19.9 6.1,21 7,21
Top keep-out:
  region: 10,4 10,2 -10,2 -10,4
Bottom:
  region: 6.75,21.75 5.95,21.75 5.931,21.569 5.841,21.217 5.684,20.89 5.467,20.599 5.196,20.356 4.884,20.171 4.541,20.051 4.182,19.999 4,20 3.818,19.999 3.459,20.051 3.116,20.171 2.804,20.356 2.533,20.599 2.316,20.89 2.159,21.217 2.069,21.569 2.05,21.75 1.25,21.75 1.277,21.497 1.421,21.008 1.652,20.553 1.96,20.148 2.338,19.805 2.77,19.536 3.245,19.35 3.745,19.253 4,19.25 4.255,19.251 4.757,19.345 5.233,19.53 5.668,19.799 6.045,20.142 6.354,20.549 6.583,21.005 6.725,21.496 6.75,21.75
  lines w0.102: 1,21 1.9,21 1.9,19.9 ; 4,19 4,19.7 ; 6.1,19.9 6.1,21 7,21
Bottom keep-out:
  region: 10,4 10,2 -10,2 -10,4
  region: 11,5.2 11,4 -11,4 -11,5.2
Top Solder:
  region: 1.25,22 2.25,22 2.258,21.828 2.325,21.492 2.457,21.175 2.647,20.89 2.89,20.647 3.175,20.457 3.492,20.325 3.828,20.258 4,20.25 4.172,20.258 4.508,20.325 4.825,20.457 5.11,20.647 5.353,20.89 5.543,21.175 5.675,21.492 5.742,21.828 5.75,22 6.75,22 6.75,21.82 6.703,21.462 6.61,21.114 6.472,20.781 6.291,20.469 6.072,20.183 5.817,19.928 5.531,19.708 5.219,19.528 4.886,19.39 4.538,19.297 4.18,19.25 4,19.25 3.82,19.25 3.462,19.297 3.114,19.39 2.781,19.528 2.469,19.708 2.183,19.928 1.928,20.183 1.708,20.469 1.528,20.781 1.39,21.114 1.297,21.462 1.25,21.82 1.25,22
Bottom Solder:
  region: 6.75,22 5.75,22 5.742,21.828 5.675,21.492 5.543,21.175 5.353,20.89 5.11,20.647 4.825,20.457 4.508,20.325 4.172,20.258 4,20.25 3.828,20.258 3.492,20.325 3.175,20.457 2.89,20.647 2.647,20.89 2.457,21.175 2.325,21.492 2.258,21.828 2.25,22 1.25,22 1.25,21.82 1.297,21.462 1.39,21.114 1.528,20.781 1.708,20.469 1.928,20.183 2.183,19.928 2.469,19.708 2.781,19.528 3.114,19.39 3.462,19.297 3.82,19.25 4,19.25 4.18,19.25 4.538,19.297 4.886,19.39 5.219,19.528 5.531,19.708 5.817,19.928 6.072,20.183 6.291,20.469 6.472,20.781 6.61,21.114 6.703,21.462 6.75,21.82 6.75,22
Dimension:
  text "Route" at 4,21.525 h0.46
  text "Out" at 4,21.075 h0.46
Milling:
  lines w0.102: -10.62,-0.8 -10.02,-0.2 ; -10.42,-0.2 -10.02,-0.2 ; -10.02,-0.6 -10.02,-0.2 ; 9.98,-0.6 9.98,-0.2 ; 10.38,-0.2 9.98,-0.2 ; 10.58,-0.8 9.98,-0.2
  text "Chamfered Edge" at -0.02,-1 h1.18
  text "0.8mm PCB" at -0.02,-2.27 h1.18
tDocu:
  lines w0.02: -10.3,0.55 10.7,0.55
tPlace:
  region: 3.961,3.675 3.961,3.715 4.601,3.715 4.601,3.675
  region: 3.881,3.635 3.881,3.675 4.681,3.675 4.681,3.635
  region: 3.841,3.595 3.841,3.635 4.681,3.635 4.681,3.595
  region: 3.841,3.555 3.841,3.595 4.681,3.595 4.681,3.555
  region: 3.841,3.515 3.841,3.555 4.681,3.555 4.681,3.515
  region: 3.841,3.475 3.841,3.515 4.681,3.515 4.681,3.475
  region: 3.841,3.435 3.841,3.475 4.641,3.475 4.641,3.435
  region: 3.841,3.395 3.841,3.435 4.121,3.435 4.121,3.395
  region: 3.841,3.355 3.841,3.395 4.121,3.395 4.121,3.355
  region: 3.841,3.315 3.841,3.355 4.121,3.355 4.121,3.315
  region: 3.841,3.275 3.841,3.315 4.441,3.315 4.441,3.275
  region: 3.841,3.235 3.841,3.275 4.521,3.275 4.521,3.235
  region: 3.841,3.195 3.841,3.235 4.521,3.235 4.521,3.195
  region: 3.841,3.155 3.841,3.195 4.521,3.195 4.521,3.155
  region: 3.841,3.115 3.841,3.155 4.521,3.155 4.521,3.115
  region: 3.841,3.075 3.841,3.115 4.521,3.115 4.521,3.075
  region: 3.841,3.035 3.841,3.075 4.481,3.075 4.481,3.035
  region: 3.841,2.995 3.841,3.035 4.121,3.035 4.121,2.995
  region: 3.841,2.955 3.841,2.995 4.121,2.995 4.121,2.955
  region: 3.841,2.915 3.841,2.955 4.121,2.955 4.121,2.915
  region: 3.841,2.875 3.841,2.915 4.601,2.915 4.601,2.875
  region: 3.841,2.835 3.841,2.875 4.681,2.875 4.681,2.835
  region: 3.841,2.795 3.841,2.835 4.681,2.835 4.681,2.795
  region: 3.841,2.755 3.841,2.795 4.681,2.795 4.681,2.755
  region: 3.841,2.715 3.841,2.755 4.681,2.755 4.681,2.715
  region: 3.841,2.675 3.841,2.715 4.681,2.715 4.681,2.675
  region: 3.881,2.635 3.881,2.675 4.641,2.675 4.641,2.635
Measures:
  lines w0.05: -11,4.6 ccw(c-10.383,4.617) -10.4,4 ; -11,21 cw(c-9.975,20.975) -10,22 ; 10,22 cw(c9.975,20.975) 11,21 11,4.6 cw(c10.383,4.617) 10.4,4
  lines w0.051: -11,4.6 -11,21 ; -10.4,4 cw(c-10.441,3.485) -9.925,3.5 -9.925,0 2.025,0 2.025,2.9 cw(c2.625,2.9) 3.225,2.9 3.225,0 9.925,0 9.925,3.5 cw(c10.436,3.491) 10.4,4 ; -10,22 1.25,22 ; 10,22 6.75,22 ; 1.25,22 2.25,22 ; 1.25,22 ccw(c4,22) 6.75,22 ; 2.25,22 ccw(c4,22) 5.75,22 ; 2.25,22 ccw(c4,22) 5.75,22 ; 5.75,22 6.75,22
  text "2222" at 0,21 h0.46

## M-2-CONNECTOR-E [mm]
pads (71):
  rect 0.3x1.55 smd paste+0: 1(9.25,-5.275) 2(9,2.275) 3(8.75,-5.275) 4(8.5,2.275) 5(8.25,-5.275) 6(8,2.275) 7(7.75,-5.275) 8(7.5,2.275) 9(7.25,-5.275) 10(7,2.275) 11(6.75,-5.275) 12(6.5,2.275) 13(6.25,-5.275) 14(6,2.275) 15(5.75,-5.275) 16(5.5,2.275) 17(5.25,-5.275) 18(5,2.275) 19(4.75,-5.275) 20(4.5,2.275) 21(4.25,-5.275) 22(4,2.275) 23(3.75,-5.275) 32(1.5,2.275) 33(1.25,-5.275) 34(1,2.275) 35(0.75,-5.275) 36(0.5,2.275) 37(0.25,-5.275) 38(0,2.275) 39(-0.25,-5.275) 40(-0.5,2.275) 41(-0.75,-5.275) 42(-1,2.275) 43(-1.25,-5.275) 44(-1.5,2.275) 45(-1.75,-5.275) 46(-2,2.275) 47(-2.25,-5.275) 48(-2.5,2.275) 49(-2.75,-5.275) 50(-3,2.275) 51(-3.25,-5.275) 52(-3.5,2.275) 53(-3.75,-5.275) 54(-4,2.275) 55(-4.25,-5.275) 56(-4.5,2.275) 57(-4.75,-5.275) 58(-5,2.275) 59(-5.25,-5.275) 60(-5.5,2.275) 61(-5.75,-5.275) 62(-6,2.275) 63(-6.25,-5.275) 64(-6.5,2.275) 65(-6.75,-5.275) 66(-7,2.275) 67(-7.25,-5.275) 68(-7.5,2.275) 69(-7.75,-5.275) 70(-8,2.275) 71(-8.25,-5.275) 72(-8.5,2.275) 73(-8.75,-5.275) 74(-9,2.275) 75(-9.25,-5.275)
  rect 1.2x2.75 smd: A1(10.35,-4.5) A2(-10.35,-4.5)
  round 1.1 hole 1.1 unplated: MH1(10,0)
  round 1.6 hole 1.6 unplated: MH2(-10,0)
Top Paste:
  drawing of 67 lines, arcs and shapes, not listed
tDocu:
  circle w0.05: c4,20 r3
  lines w0.05: -11,3.6 ccw(c-10.383,3.617) -10.4,3 ; -11,19 cw(c-9.975,18.975) -10,20 ; 10,20 cw(c9.975,18.975) 11,19 11,3.6 cw(c10.383,3.617) 10.4,3
  lines w0.051: -11,3.6 -11,19 ; -10.4,3 cw(c-10.441,2.485) -9.925,2.5 -9.925,-1 2.025,-1 2.025,1.9 cw(c2.625,1.9) 3.225,1.9 3.225,-1 9.925,-1 9.925,2.5 cw(c10.436,2.491) 10.4,3 ; -10,20 10,20
  lines w0.152: -10.95,-5.25 -10.95,2.5 -9.925,2.5 9.925,2.5 10.95,2.5 10.95,-5.25 -10.95,-5.25
tPlace:
  lines w0.152: -11,-2.5 -11,2.5 -9.5,2.5 ; 9.5,2.5 11,2.5 11,-2.5

## METER_BASE [mm]
pads (23):
  round 1.508 hole 1: P1(22.2,2.276) P2(22.2,4.816) P3(24.74,2.276) P4(24.74,4.816) P5(27.28,2.276) P6(27.28,4.816) P7(29.82,2.276) P8(29.82,4.816) P9(32.36,2.276) P10(32.36,4.816) P11(34.9,2.276) P12(34.9,4.816) P13(37.44,2.276) P14(37.44,4.816) P15(39.98,2.276) P16(39.98,4.816) P17(42.52,2.276) P18(42.52,4.816) P19(45.06,2.276) P20(45.06,4.816)
  rect 1.508x1.508 / inner round 1.393 / far side rect 1.508x1.508 hole 1: P21(4,26.046) P22(4,20.966) P23(45,26.046)
tPlace:
  lines w0.127: 0,0 48,0 48,29 0,29 0,0